# Altium footprint library 排针-排母-1.27.PcbLib: 152 footprints (part 9 of 10)
Each footprint in its own frame and in the unit in brackets; x right, y up, seen from the top. Pads: shape width x height; smd on the part's side, far side on the other; paste and mask are expansions set on the pad; w line width, h text height; cw(c..) or ccw(c..) is an arc to the next point about the centre after c.
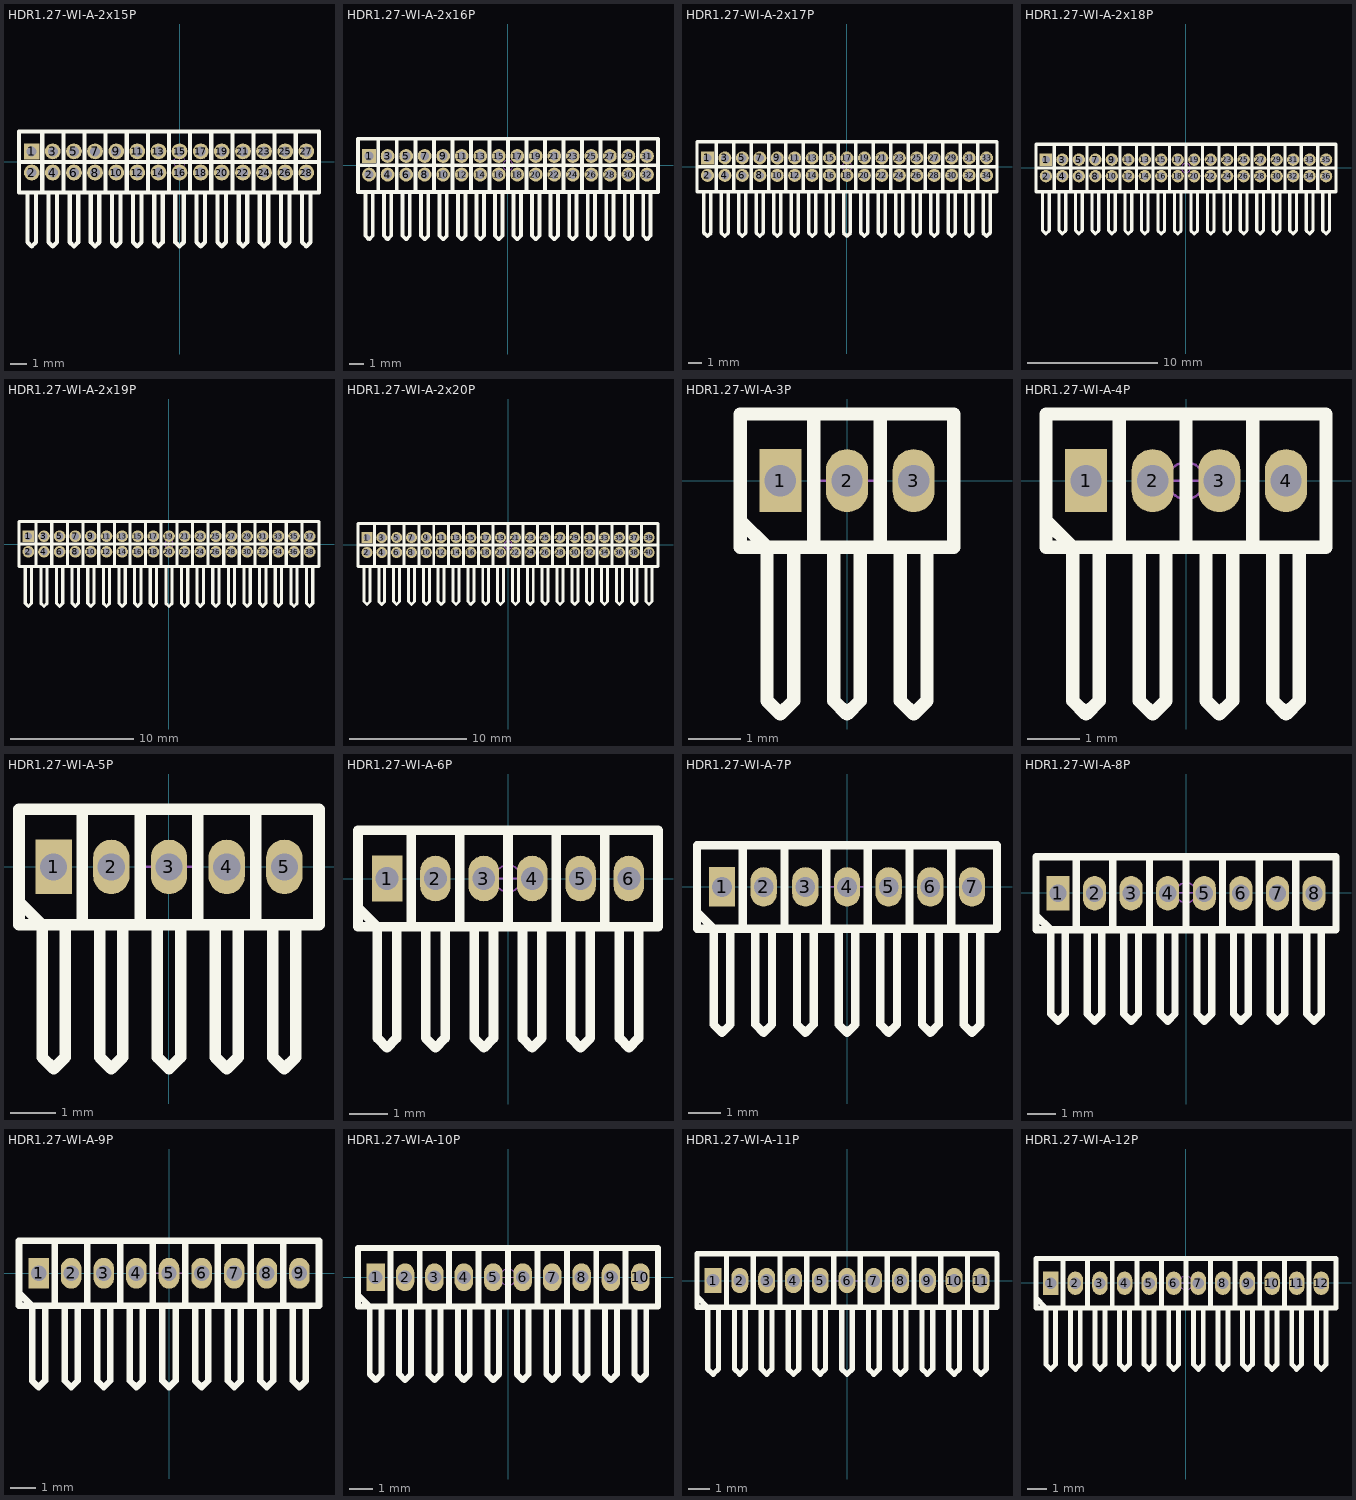
[diagram p8: the footprints below, top view; thin cyan lines are the x and y axes]

## HDR1.27-WI-A-2x15P [mm] "双排直插，脚距：1.27mm"
pads (28):
  rect 0.95x0.95 hole 0.6: 1(-8.89,0.635)
  round 0.95 hole 0.6: 2(-8.89,-0.635) 3(-7.62,0.635) 4(-7.62,-0.635) 5(-6.35,0.635) 6(-6.35,-0.635) 7(-5.08,0.635) 8(-5.08,-0.635) 9(-3.81,0.635) 10(-3.81,-0.635) 11(-2.54,0.635) 12(-2.54,-0.635) 13(-1.27,0.635) 14(-1.27,-0.635) 15(0,0.635) 16(0,-0.635) 17(1.27,0.635) 18(1.27,-0.635) 19(2.54,0.635) 20(2.54,-0.635) 21(3.81,0.635) 22(3.81,-0.635) 23(5.08,0.635) 24(5.08,-0.635) 25(6.35,0.635) 26(6.35,-0.635) 27(7.62,0.635) 28(7.62,-0.635)
Top Overlay:
  lines w0.254: -9.652,0 8.382,0 ; -9.144,-1.905 -9.144,-4.826 -8.89,-5.08 -8.636,-4.826 -8.636,-1.905 ; -8.255,-1.829 -8.255,1.829 ; -7.874,-1.905 -7.874,-4.826 -7.62,-5.08 -7.366,-4.826 -7.366,-1.905 ; -6.985,-1.829 -6.985,1.829 ; -6.604,-1.905 -6.604,-4.826 -6.35,-5.08 -6.096,-4.826 -6.096,-1.905 ; -5.715,-1.829 -5.715,1.829 ; -5.334,-1.905 -5.334,-4.826 -5.08,-5.08 -4.826,-4.826 -4.826,-1.905 ; -4.445,-1.829 -4.445,1.829 ; -4.064,-1.905 -4.064,-4.826 -3.81,-5.08 -3.556,-4.826 -3.556,-1.905 ; -3.175,-1.829 -3.175,1.829 ; -2.794,-1.905 -2.794,-4.826 -2.54,-5.08 -2.286,-4.826 -2.286,-1.905 ; -1.905,-1.829 -1.905,1.829 ; -1.524,-1.905 -1.524,-4.826 -1.27,-5.08 -1.016,-4.826 -1.016,-1.905 ; -0.635,-1.829 -0.635,1.829 ; -0.254,-1.905 -0.254,-4.826 0,-5.08 0.254,-4.826 0.254,-1.905 ; 0.635,-1.829 0.635,1.829 ; 1.016,-1.905 1.016,-4.826 1.27,-5.08 1.524,-4.826 1.524,-1.905 ; 1.905,-1.829 1.905,1.829 ; 2.286,-1.905 2.286,-4.826 2.54,-5.08 2.794,-4.826 2.794,-1.905 ; 3.175,-1.829 3.175,1.829 ; 3.556,-1.905 3.556,-4.826 3.81,-5.08 4.064,-4.826 4.064,-1.905 ; 4.445,-1.829 4.445,1.829 ; 4.826,-1.905 4.826,-4.826 5.08,-5.08 5.334,-4.826 5.334,-1.905 ; 5.715,-1.829 5.715,1.829 ; 6.096,-1.905 6.096,-4.826 6.35,-5.08 6.604,-4.826 6.604,-1.905 ; 6.985,-1.829 6.985,1.829 ; 7.366,-1.905 7.366,-4.826 7.62,-5.08 7.874,-4.826 7.874,-1.905 ; -9.652,-1.829 -9.652,1.829 8.382,1.829 8.382,-1.829 -9.652,-1.829
Mechanical 15:
  circle w0.05: c0,0 r0.35
  lines w0.05: -0.5,0 0.5,0 ; 0,-0.5 0,0.5
3D body: height 5.14, standoff -2.65, extent 6.985,-4.7 8.255,1.7
3D body: height 5.14, standoff -2.65, extent 5.715,-4.7 6.985,1.7
3D body: height 5.14, standoff -2.65, extent 4.445,-4.7 5.715,1.7
3D body: height 5.14, standoff -2.65, extent 3.175,-4.7 4.445,1.7
3D body: height 5.14, standoff -2.65, extent 1.905,-4.7 3.175,1.7
3D body: height 5.14, standoff -2.65, extent 0.635,-4.7 1.905,1.7
3D body: height 5.14, standoff -2.65, extent -0.635,-4.7 0.635,1.7
3D body: height 5.14, standoff -2.65, extent -1.905,-4.7 -0.635,1.7
3D body: height 5.14, standoff -2.65, extent -3.175,-4.7 -1.905,1.7
3D body: height 5.14, standoff -2.65, extent -4.445,-4.7 -3.175,1.7
3D body: height 5.14, standoff -2.65, extent -5.715,-4.7 -4.445,1.7
3D body: height 5.14, standoff -2.65, extent -6.985,-4.7 -5.715,1.7
3D body: height 5.14, standoff -2.65, extent -8.255,-4.7 -6.985,1.7
3D body: height 5.14, standoff -2.65, extent -9.525,-4.7 -8.255,1.7

## HDR1.27-WI-A-2x16P [mm] "双排直插，脚距：1.27mm"
pads (32):
  rect 0.95x0.95 hole 0.6: 1(-9.525,0.635)
  round 0.95 hole 0.6: 2(-9.525,-0.635) 3(-8.255,0.635) 4(-8.255,-0.635) 5(-6.985,0.635) 6(-6.985,-0.635) 7(-5.715,0.635) 8(-5.715,-0.635) 9(-4.445,0.635) 10(-4.445,-0.635) 11(-3.175,0.635) 12(-3.175,-0.635) 13(-1.905,0.635) 14(-1.905,-0.635) 15(-0.635,0.635) 16(-0.635,-0.635) 17(0.635,0.635) 18(0.635,-0.635) 19(1.905,0.635) 20(1.905,-0.635) 21(3.175,0.635) 22(3.175,-0.635) 23(4.445,0.635) 24(4.445,-0.635) 25(5.715,0.635) 26(5.715,-0.635) 27(6.985,0.635) 28(6.985,-0.635) 29(8.255,0.635) 30(8.255,-0.635) 31(9.525,0.635) 32(9.525,-0.635)
Top Overlay:
  lines w0.254: -10.287,0 10.287,0 ; -9.779,-1.905 -9.779,-4.826 -9.525,-5.08 -9.271,-4.826 -9.271,-1.905 ; -8.89,-1.829 -8.89,1.829 ; -8.509,-1.905 -8.509,-4.826 -8.255,-5.08 -8.001,-4.826 -8.001,-1.905 ; -7.62,-1.829 -7.62,1.829 ; -7.239,-1.905 -7.239,-4.826 -6.985,-5.08 -6.731,-4.826 -6.731,-1.905 ; -6.35,-1.829 -6.35,1.829 ; -5.969,-1.905 -5.969,-4.826 -5.715,-5.08 -5.461,-4.826 -5.461,-1.905 ; -5.08,-1.829 -5.08,1.829 ; -4.699,-1.905 -4.699,-4.826 -4.445,-5.08 -4.191,-4.826 -4.191,-1.905 ; -3.81,-1.829 -3.81,1.829 ; -3.429,-1.905 -3.429,-4.826 -3.175,-5.08 -2.921,-4.826 -2.921,-1.905 ; -2.54,-1.829 -2.54,1.829 ; -2.159,-1.905 -2.159,-4.826 -1.905,-5.08 -1.651,-4.826 -1.651,-1.905 ; -1.27,-1.829 -1.27,1.829 ; -0.889,-1.905 -0.889,-4.826 -0.635,-5.08 -0.381,-4.826 -0.381,-1.905 ; 0,-1.829 0,1.829 ; 0.381,-1.905 0.381,-4.826 0.635,-5.08 0.889,-4.826 0.889,-1.905 ; 1.27,-1.829 1.27,1.829 ; 1.651,-1.905 1.651,-4.826 1.905,-5.08 2.159,-4.826 2.159,-1.905 ; 2.54,-1.829 2.54,1.829 ; 2.921,-1.905 2.921,-4.826 3.175,-5.08 3.429,-4.826 3.429,-1.905 ; 3.81,-1.829 3.81,1.829 ; 4.191,-1.905 4.191,-4.826 4.445,-5.08 4.699,-4.826 4.699,-1.905 ; 5.08,-1.829 5.08,1.829 ; 5.461,-1.905 5.461,-4.826 5.715,-5.08 5.969,-4.826 5.969,-1.905 ; 6.35,-1.829 6.35,1.829 ; 6.731,-1.905 6.731,-4.826 6.985,-5.08 7.239,-4.826 7.239,-1.905 ; 7.62,-1.829 7.62,1.829 ; 8.001,-1.905 8.001,-4.826 8.255,-5.08 8.509,-4.826 8.509,-1.905 ; 8.89,-1.829 8.89,1.829 ; 9.271,-1.905 9.271,-4.826 9.525,-5.08 9.779,-4.826 9.779,-1.905 ; -10.287,-1.829 10.287,-1.829 10.287,1.829 -10.287,1.829 -10.287,-1.829
Mechanical 15:
  circle w0.05: c0,0 r0.35
  lines w0.05: -0.5,0 0.5,0 ; 0,-0.5 0,0.5
3D body: height 5.14, standoff -2.65, extent -10.16,-4.7 -8.89,1.7
3D body: height 5.14, standoff -2.65, extent -8.89,-4.7 -7.62,1.7
3D body: height 5.14, standoff -2.65, extent -7.62,-4.7 -6.35,1.7
3D body: height 5.14, standoff -2.65, extent -6.35,-4.7 -5.08,1.7
3D body: height 5.14, standoff -2.65, extent -5.08,-4.7 -3.81,1.7
3D body: height 5.14, standoff -2.65, extent -3.81,-4.7 -2.54,1.7
3D body: height 5.14, standoff -2.65, extent -2.54,-4.7 -1.27,1.7
3D body: height 5.14, standoff -2.65, extent -1.27,-4.7 0,1.7
3D body: height 5.14, standoff -2.65, extent 0,-4.7 1.27,1.7
3D body: height 5.14, standoff -2.65, extent 1.27,-4.7 2.54,1.7
3D body: height 5.14, standoff -2.65, extent 2.54,-4.7 3.81,1.7
3D body: height 5.14, standoff -2.65, extent 3.81,-4.7 5.08,1.7
3D body: height 5.14, standoff -2.65, extent 5.08,-4.7 6.35,1.7
3D body: height 5.14, standoff -2.65, extent 6.35,-4.7 7.62,1.7
3D body: height 5.14, standoff -2.65, extent 7.62,-4.7 8.89,1.7
3D body: height 5.14, standoff -2.65, extent 8.89,-4.7 10.16,1.7

## HDR1.27-WI-A-2x17P [mm] "双排直插，脚距：1.27mm"
pads (34):
  rect 0.95x0.95 hole 0.6: 1(-10.16,0.635)
  round 0.95 hole 0.6: 2(-10.16,-0.635) 3(-8.89,0.635) 4(-8.89,-0.635) 5(-7.62,0.635) 6(-7.62,-0.635) 7(-6.35,0.635) 8(-6.35,-0.635) 9(-5.08,0.635) 10(-5.08,-0.635) 11(-3.81,0.635) 12(-3.81,-0.635) 13(-2.54,0.635) 14(-2.54,-0.635) 15(-1.27,0.635) 16(-1.27,-0.635) 17(0,0.635) 18(0,-0.635) 19(1.27,0.635) 20(1.27,-0.635) 21(2.54,0.635) 22(2.54,-0.635) 23(3.81,0.635) 24(3.81,-0.635) 25(5.08,0.635) 26(5.08,-0.635) 27(6.35,0.635) 28(6.35,-0.635) 29(7.62,0.635) 30(7.62,-0.635) 31(8.89,0.635) 32(8.89,-0.635) 33(10.16,0.635) 34(10.16,-0.635)
Top Overlay:
  lines w0.254: -10.922,0 10.922,0 ; -10.414,-1.905 -10.414,-4.826 -10.16,-5.08 -9.906,-4.826 -9.906,-1.905 ; -9.525,-1.829 -9.525,1.829 ; -9.144,-1.905 -9.144,-4.826 -8.89,-5.08 -8.636,-4.826 -8.636,-1.905 ; -8.255,-1.829 -8.255,1.829 ; -7.874,-1.905 -7.874,-4.826 -7.62,-5.08 -7.366,-4.826 -7.366,-1.905 ; -6.985,-1.829 -6.985,1.829 ; -6.604,-1.905 -6.604,-4.826 -6.35,-5.08 -6.096,-4.826 -6.096,-1.905 ; -5.715,-1.829 -5.715,1.829 ; -5.334,-1.905 -5.334,-4.826 -5.08,-5.08 -4.826,-4.826 -4.826,-1.905 ; -4.445,-1.829 -4.445,1.829 ; -4.064,-1.905 -4.064,-4.826 -3.81,-5.08 -3.556,-4.826 -3.556,-1.905 ; -3.175,-1.829 -3.175,1.829 ; -2.794,-1.905 -2.794,-4.826 -2.54,-5.08 -2.286,-4.826 -2.286,-1.905 ; -1.905,-1.829 -1.905,1.829 ; -1.524,-1.905 -1.524,-4.826 -1.27,-5.08 -1.016,-4.826 -1.016,-1.905 ; -0.635,-1.829 -0.635,1.829 ; -0.254,-1.905 -0.254,-4.826 0,-5.08 0.254,-4.826 0.254,-1.905 ; 0.635,-1.829 0.635,1.829 ; 1.016,-1.905 1.016,-4.826 1.27,-5.08 1.524,-4.826 1.524,-1.905 ; 1.905,-1.829 1.905,1.829 ; 2.286,-1.905 2.286,-4.826 2.54,-5.08 2.794,-4.826 2.794,-1.905 ; 3.175,-1.829 3.175,1.829 ; 3.556,-1.905 3.556,-4.826 3.81,-5.08 4.064,-4.826 4.064,-1.905 ; 4.445,-1.829 4.445,1.829 ; 4.826,-1.905 4.826,-4.826 5.08,-5.08 5.334,-4.826 5.334,-1.905 ; 5.715,-1.829 5.715,1.829 ; 6.096,-1.905 6.096,-4.826 6.35,-5.08 6.604,-4.826 6.604,-1.905 ; 6.985,-1.829 6.985,1.829 ; 7.366,-1.905 7.366,-4.826 7.62,-5.08 7.874,-4.826 7.874,-1.905 ; 8.255,-1.829 8.255,1.829 ; 8.636,-1.905 8.636,-4.826 8.89,-5.08 9.144,-4.826 9.144,-1.905 ; 9.525,-1.829 9.525,1.829 ; 9.906,-1.905 9.906,-4.826 10.16,-5.08 10.414,-4.826 10.414,-1.905 ; -10.922,-1.829 10.922,-1.829 10.922,1.829 -10.922,1.829 -10.922,-1.829
Mechanical 15:
  circle w0.05: c0,0 r0.35
  lines w0.05: -0.5,0 0.5,0 ; 0,-0.5 0,0.5
3D body: height 5.14, standoff -2.65, extent -10.795,-4.7 -9.525,1.7
3D body: height 5.14, standoff -2.65, extent -9.525,-4.7 -8.255,1.7
3D body: height 5.14, standoff -2.65, extent -8.255,-4.7 -6.985,1.7
3D body: height 5.14, standoff -2.65, extent -6.985,-4.7 -5.715,1.7
3D body: height 5.14, standoff -2.65, extent -5.715,-4.7 -4.445,1.7
3D body: height 5.14, standoff -2.65, extent -4.445,-4.7 -3.175,1.7
3D body: height 5.14, standoff -2.65, extent -3.175,-4.7 -1.905,1.7
3D body: height 5.14, standoff -2.65, extent -1.905,-4.7 -0.635,1.7
3D body: height 5.14, standoff -2.65, extent -0.635,-4.7 0.635,1.7
3D body: height 5.14, standoff -2.65, extent 0.635,-4.7 1.905,1.7
3D body: height 5.14, standoff -2.65, extent 1.905,-4.7 3.175,1.7
3D body: height 5.14, standoff -2.65, extent 3.175,-4.7 4.445,1.7
3D body: height 5.14, standoff -2.65, extent 4.445,-4.7 5.715,1.7
3D body: height 5.14, standoff -2.65, extent 5.715,-4.7 6.985,1.7
3D body: height 5.14, standoff -2.65, extent 6.985,-4.7 8.255,1.7
3D body: height 5.14, standoff -2.65, extent 8.255,-4.7 9.525,1.7
3D body: height 5.14, standoff -2.65, extent 9.525,-4.7 10.795,1.7

## HDR1.27-WI-A-2x18P [mm] "双排直插，脚距：1.27mm"
pads (36):
  rect 0.95x0.95 hole 0.6: 1(-10.795,0.635)
  round 0.95 hole 0.6: 2(-10.795,-0.635) 3(-9.525,0.635) 4(-9.525,-0.635) 5(-8.255,0.635) 6(-8.255,-0.635) 7(-6.985,0.635) 8(-6.985,-0.635) 9(-5.715,0.635) 10(-5.715,-0.635) 11(-4.445,0.635) 12(-4.445,-0.635) 13(-3.175,0.635) 14(-3.175,-0.635) 15(-1.905,0.635) 16(-1.905,-0.635) 17(-0.635,0.635) 18(-0.635,-0.635) 19(0.635,0.635) 20(0.635,-0.635) 21(1.905,0.635) 22(1.905,-0.635) 23(3.175,0.635) 24(3.175,-0.635) 25(4.445,0.635) 26(4.445,-0.635) 27(5.715,0.635) 28(5.715,-0.635) 29(6.985,0.635) 30(6.985,-0.635) 31(8.255,0.635) 32(8.255,-0.635) 33(9.525,0.635) 34(9.525,-0.635) 35(10.795,0.635) 36(10.795,-0.635)
Top Overlay:
  lines w0.254: -11.557,0 11.557,0 ; -11.049,-1.905 -11.049,-4.826 -10.795,-5.08 -10.541,-4.826 -10.541,-1.905 ; -10.16,-1.829 -10.16,1.829 ; -9.779,-1.905 -9.779,-4.826 -9.525,-5.08 -9.271,-4.826 -9.271,-1.905 ; -8.89,-1.829 -8.89,1.829 ; -8.509,-1.905 -8.509,-4.826 -8.255,-5.08 -8.001,-4.826 -8.001,-1.905 ; -7.62,-1.829 -7.62,1.829 ; -7.239,-1.905 -7.239,-4.826 -6.985,-5.08 -6.731,-4.826 -6.731,-1.905 ; -6.35,-1.829 -6.35,1.829 ; -5.969,-1.905 -5.969,-4.826 -5.715,-5.08 -5.461,-4.826 -5.461,-1.905 ; -5.08,-1.829 -5.08,1.829 ; -4.699,-1.905 -4.699,-4.826 -4.445,-5.08 -4.191,-4.826 -4.191,-1.905 ; -3.81,-1.829 -3.81,1.829 ; -3.429,-1.905 -3.429,-4.826 -3.175,-5.08 -2.921,-4.826 -2.921,-1.905 ; -2.54,-1.829 -2.54,1.829 ; -2.159,-1.905 -2.159,-4.826 -1.905,-5.08 -1.651,-4.826 -1.651,-1.905 ; -1.27,-1.829 -1.27,1.829 ; -0.889,-1.905 -0.889,-4.826 -0.635,-5.08 -0.381,-4.826 -0.381,-1.905 ; 0,-1.829 0,1.829 ; 0.381,-1.905 0.381,-4.826 0.635,-5.08 0.889,-4.826 0.889,-1.905 ; 1.27,-1.829 1.27,1.829 ; 1.651,-1.905 1.651,-4.826 1.905,-5.08 2.159,-4.826 2.159,-1.905 ; 2.54,-1.829 2.54,1.829 ; 2.921,-1.905 2.921,-4.826 3.175,-5.08 3.429,-4.826 3.429,-1.905 ; 3.81,-1.829 3.81,1.829 ; 4.191,-1.905 4.191,-4.826 4.445,-5.08 4.699,-4.826 4.699,-1.905 ; 5.08,-1.829 5.08,1.829 ; 5.461,-1.905 5.461,-4.826 5.715,-5.08 5.969,-4.826 5.969,-1.905 ; 6.35,-1.829 6.35,1.829 ; 6.731,-1.905 6.731,-4.826 6.985,-5.08 7.239,-4.826 7.239,-1.905 ; 7.62,-1.829 7.62,1.829 ; 8.001,-1.905 8.001,-4.826 8.255,-5.08 8.509,-4.826 8.509,-1.905 ; 8.89,-1.829 8.89,1.829 ; 9.271,-1.905 9.271,-4.826 9.525,-5.08 9.779,-4.826 9.779,-1.905 ; 10.16,-1.829 10.16,1.829 ; 10.541,-1.905 10.541,-4.826 10.795,-5.08 11.049,-4.826 11.049,-1.905 ; -11.557,-1.829 11.557,-1.829 11.557,1.829 -11.557,1.829 -11.557,-1.829
Mechanical 15:
  circle w0.05: c0,0 r0.35
  lines w0.05: -0.5,0 0.5,0 ; 0,-0.5 0,0.5
3D body: height 5.14, standoff -2.65, extent -11.43,-4.7 -10.16,1.7
3D body: height 5.14, standoff -2.65, extent -10.16,-4.7 -8.89,1.7
3D body: height 5.14, standoff -2.65, extent -8.89,-4.7 -7.62,1.7
3D body: height 5.14, standoff -2.65, extent -7.62,-4.7 -6.35,1.7
3D body: height 5.14, standoff -2.65, extent -6.35,-4.7 -5.08,1.7
3D body: height 5.14, standoff -2.65, extent -5.08,-4.7 -3.81,1.7
3D body: height 5.14, standoff -2.65, extent -3.81,-4.7 -2.54,1.7
3D body: height 5.14, standoff -2.65, extent -2.54,-4.7 -1.27,1.7
3D body: height 5.14, standoff -2.65, extent -1.27,-4.7 0,1.7
3D body: height 5.14, standoff -2.65, extent 0,-4.7 1.27,1.7
3D body: height 5.14, standoff -2.65, extent 1.27,-4.7 2.54,1.7
3D body: height 5.14, standoff -2.65, extent 2.54,-4.7 3.81,1.7
3D body: height 5.14, standoff -2.65, extent 3.81,-4.7 5.08,1.7
3D body: height 5.14, standoff -2.65, extent 5.08,-4.7 6.35,1.7
3D body: height 5.14, standoff -2.65, extent 6.35,-4.7 7.62,1.7
3D body: height 5.14, standoff -2.65, extent 7.62,-4.7 8.89,1.7
3D body: height 5.14, standoff -2.65, extent 8.89,-4.7 10.16,1.7
3D body: height 5.14, standoff -2.65, extent 10.16,-4.7 11.43,1.7

## HDR1.27-WI-A-2x19P [mm] "双排直插，脚距：1.27mm"
pads (38):
  rect 0.95x0.95 hole 0.6: 1(-11.43,0.635)
  round 0.95 hole 0.6: 2(-11.43,-0.635) 3(-10.16,0.635) 4(-10.16,-0.635) 5(-8.89,0.635) 6(-8.89,-0.635) 7(-7.62,0.635) 8(-7.62,-0.635) 9(-6.35,0.635) 10(-6.35,-0.635) 11(-5.08,0.635) 12(-5.08,-0.635) 13(-3.81,0.635) 14(-3.81,-0.635) 15(-2.54,0.635) 16(-2.54,-0.635) 17(-1.27,0.635) 18(-1.27,-0.635) 19(0,0.635) 20(0,-0.635) 21(1.27,0.635) 22(1.27,-0.635) 23(2.54,0.635) 24(2.54,-0.635) 25(3.81,0.635) 26(3.81,-0.635) 27(5.08,0.635) 28(5.08,-0.635) 29(6.35,0.635) 30(6.35,-0.635) 31(7.62,0.635) 32(7.62,-0.635) 33(8.89,0.635) 34(8.89,-0.635) 35(10.16,0.635) 36(10.16,-0.635) 37(11.43,0.635) 38(11.43,-0.635)
Top Overlay:
  lines w0.254: -12.192,0 12.192,0 ; -11.684,-1.905 -11.684,-4.826 -11.43,-5.08 -11.176,-4.826 -11.176,-1.905 ; -10.795,-1.829 -10.795,1.829 ; -10.414,-1.905 -10.414,-4.826 -10.16,-5.08 -9.906,-4.826 -9.906,-1.905 ; -9.525,-1.829 -9.525,1.829 ; -9.144,-1.905 -9.144,-4.826 -8.89,-5.08 -8.636,-4.826 -8.636,-1.905 ; -8.255,-1.829 -8.255,1.829 ; -7.874,-1.905 -7.874,-4.826 -7.62,-5.08 -7.366,-4.826 -7.366,-1.905 ; -6.985,-1.829 -6.985,1.829 ; -6.604,-1.905 -6.604,-4.826 -6.35,-5.08 -6.096,-4.826 -6.096,-1.905 ; -5.715,-1.829 -5.715,1.829 ; -5.334,-1.905 -5.334,-4.826 -5.08,-5.08 -4.826,-4.826 -4.826,-1.905 ; -4.445,-1.829 -4.445,1.829 ; -4.064,-1.905 -4.064,-4.826 -3.81,-5.08 -3.556,-4.826 -3.556,-1.905 ; -3.175,-1.829 -3.175,1.829 ; -2.794,-1.905 -2.794,-4.826 -2.54,-5.08 -2.286,-4.826 -2.286,-1.905 ; -1.905,-1.829 -1.905,1.829 ; -1.524,-1.905 -1.524,-4.826 -1.27,-5.08 -1.016,-4.826 -1.016,-1.905 ; -0.635,-1.829 -0.635,1.829 ; -0.254,-1.905 -0.254,-4.826 0,-5.08 0.254,-4.826 0.254,-1.905 ; 0.635,-1.829 0.635,1.829 ; 1.016,-1.905 1.016,-4.826 1.27,-5.08 1.524,-4.826 1.524,-1.905 ; 1.905,-1.829 1.905,1.829 ; 2.286,-1.905 2.286,-4.826 2.54,-5.08 2.794,-4.826 2.794,-1.905 ; 3.175,-1.829 3.175,1.829 ; 3.556,-1.905 3.556,-4.826 3.81,-5.08 4.064,-4.826 4.064,-1.905 ; 4.445,-1.829 4.445,1.829 ; 4.826,-1.905 4.826,-4.826 5.08,-5.08 5.334,-4.826 5.334,-1.905 ; 5.715,-1.829 5.715,1.829 ; 6.096,-1.905 6.096,-4.826 6.35,-5.08 6.604,-4.826 6.604,-1.905 ; 6.985,-1.829 6.985,1.829 ; 7.366,-1.905 7.366,-4.826 7.62,-5.08 7.874,-4.826 7.874,-1.905 ; 8.255,-1.829 8.255,1.829 ; 8.636,-1.905 8.636,-4.826 8.89,-5.08 9.144,-4.826 9.144,-1.905 ; 9.525,-1.829 9.525,1.829 ; 9.906,-1.905 9.906,-4.826 10.16,-5.08 10.414,-4.826 10.414,-1.905 ; 10.795,-1.829 10.795,1.829 ; 11.176,-1.905 11.176,-4.826 11.43,-5.08 11.684,-4.826 11.684,-1.905 ; -12.192,-1.829 -12.192,1.829 12.192,1.829 12.192,-1.829 -12.192,-1.829
Mechanical 15:
  circle w0.05: c0,0 r0.35
  lines w0.05: -0.5,0 0.5,0 ; 0,-0.5 0,0.5
3D body: height 5.14, standoff -2.65, extent 10.795,-4.7 12.065,1.7
3D body: height 5.14, standoff -2.65, extent 9.525,-4.7 10.795,1.7
3D body: height 5.14, standoff -2.65, extent 8.255,-4.7 9.525,1.7
3D body: height 5.14, standoff -2.65, extent 6.985,-4.7 8.255,1.7
3D body: height 5.14, standoff -2.65, extent 5.715,-4.7 6.985,1.7
3D body: height 5.14, standoff -2.65, extent 4.445,-4.7 5.715,1.7
3D body: height 5.14, standoff -2.65, extent 3.175,-4.7 4.445,1.7
3D body: height 5.14, standoff -2.65, extent 1.905,-4.7 3.175,1.7
3D body: height 5.14, standoff -2.65, extent 0.635,-4.7 1.905,1.7
3D body: height 5.14, standoff -2.65, extent -0.635,-4.7 0.635,1.7
3D body: height 5.14, standoff -2.65, extent -1.905,-4.7 -0.635,1.7
3D body: height 5.14, standoff -2.65, extent -3.175,-4.7 -1.905,1.7
3D body: height 5.14, standoff -2.65, extent -4.445,-4.7 -3.175,1.7
3D body: height 5.14, standoff -2.65, extent -5.715,-4.7 -4.445,1.7
3D body: height 5.14, standoff -2.65, extent -6.985,-4.7 -5.715,1.7
3D body: height 5.14, standoff -2.65, extent -8.255,-4.7 -6.985,1.7
3D body: height 5.14, standoff -2.65, extent -9.525,-4.7 -8.255,1.7
3D body: height 5.14, standoff -2.65, extent -10.795,-4.7 -9.525,1.7
3D body: height 5.14, standoff -2.65, extent -12.065,-4.7 -10.795,1.7

## HDR1.27-WI-A-2x20P [mm] "双排直插，脚距：1.27mm"
pads (40):
  rect 0.95x0.95 hole 0.6: 1(-12.065,0.635)
  round 0.95 hole 0.6: 2(-12.065,-0.635) 3(-10.795,0.635) 4(-10.795,-0.635) 5(-9.525,0.635) 6(-9.525,-0.635) 7(-8.255,0.635) 8(-8.255,-0.635) 9(-6.985,0.635) 10(-6.985,-0.635) 11(-5.715,0.635) 12(-5.715,-0.635) 13(-4.445,0.635) 14(-4.445,-0.635) 15(-3.175,0.635) 16(-3.175,-0.635) 17(-1.905,0.635) 18(-1.905,-0.635) 19(-0.635,0.635) 20(-0.635,-0.635) 21(0.635,0.635) 22(0.635,-0.635) 23(1.905,0.635) 24(1.905,-0.635) 25(3.175,0.635) 26(3.175,-0.635) 27(4.445,0.635) 28(4.445,-0.635) 29(5.715,0.635) 30(5.715,-0.635) 31(6.985,0.635) 32(6.985,-0.635) 33(8.255,0.635) 34(8.255,-0.635) 35(9.525,0.635) 36(9.525,-0.635) 37(10.795,0.635) 38(10.795,-0.635) 39(12.065,0.635) 40(12.065,-0.635)
Top Overlay:
  lines w0.254: -12.827,0 12.827,0 ; -12.319,-1.905 -12.319,-4.826 -12.065,-5.08 -11.811,-4.826 -11.811,-1.905 ; -11.43,-1.829 -11.43,1.829 ; -11.049,-1.905 -11.049,-4.826 -10.795,-5.08 -10.541,-4.826 -10.541,-1.905 ; -10.16,-1.829 -10.16,1.829 ; -9.779,-1.905 -9.779,-4.826 -9.525,-5.08 -9.271,-4.826 -9.271,-1.905 ; -8.89,-1.829 -8.89,1.829 ; -8.509,-1.905 -8.509,-4.826 -8.255,-5.08 -8.001,-4.826 -8.001,-1.905 ; -7.62,-1.829 -7.62,1.829 ; -7.239,-1.905 -7.239,-4.826 -6.985,-5.08 -6.731,-4.826 -6.731,-1.905 ; -6.35,-1.829 -6.35,1.829 ; -5.969,-1.905 -5.969,-4.826 -5.715,-5.08 -5.461,-4.826 -5.461,-1.905 ; -5.08,-1.829 -5.08,1.829 ; -4.699,-1.905 -4.699,-4.826 -4.445,-5.08 -4.191,-4.826 -4.191,-1.905 ; -3.81,-1.829 -3.81,1.829 ; -3.429,-1.905 -3.429,-4.826 -3.175,-5.08 -2.921,-4.826 -2.921,-1.905 ; -2.54,-1.829 -2.54,1.829 ; -2.159,-1.905 -2.159,-4.826 -1.905,-5.08 -1.651,-4.826 -1.651,-1.905 ; -1.27,-1.829 -1.27,1.829 ; -0.889,-1.905 -0.889,-4.826 -0.635,-5.08 -0.381,-4.826 -0.381,-1.905 ; 0,-1.829 0,1.829 ; 0.381,-1.905 0.381,-4.826 0.635,-5.08 0.889,-4.826 0.889,-1.905 ; 1.27,-1.829 1.27,1.829 ; 1.651,-1.905 1.651,-4.826 1.905,-5.08 2.159,-4.826 2.159,-1.905 ; 2.54,-1.829 2.54,1.829 ; 2.921,-1.905 2.921,-4.826 3.175,-5.08 3.429,-4.826 3.429,-1.905 ; 3.81,-1.829 3.81,1.829 ; 4.191,-1.905 4.191,-4.826 4.445,-5.08 4.699,-4.826 4.699,-1.905 ; 5.08,-1.829 5.08,1.829 ; 5.461,-1.905 5.461,-4.826 5.715,-5.08 5.969,-4.826 5.969,-1.905 ; 6.35,-1.829 6.35,1.829 ; 6.731,-1.905 6.731,-4.826 6.985,-5.08 7.239,-4.826 7.239,-1.905 ; 7.62,-1.829 7.62,1.829 ; 8.001,-1.905 8.001,-4.826 8.255,-5.08 8.509,-4.826 8.509,-1.905 ; 8.89,-1.829 8.89,1.829 ; 9.271,-1.905 9.271,-4.826 9.525,-5.08 9.779,-4.826 9.779,-1.905 ; 10.16,-1.829 10.16,1.829 ; 10.541,-1.905 10.541,-4.826 10.795,-5.08 11.049,-4.826 11.049,-1.905 ; 11.43,-1.829 11.43,1.829 ; 11.811,-1.905 11.811,-4.826 12.065,-5.08 12.319,-4.826 12.319,-1.905 ; -12.827,-1.829 -12.827,1.829 12.827,1.829 12.827,-1.829 -12.827,-1.829
Mechanical 15:
  circle w0.05: c0,0 r0.35
  lines w0.05: -0.5,0 0.5,0 ; 0,-0.5 0,0.5
3D body: height 5.14, standoff -2.65, extent 11.43,-4.7 12.7,1.7
3D body: height 5.14, standoff -2.65, extent 10.16,-4.7 11.43,1.7
3D body: height 5.14, standoff -2.65, extent 8.89,-4.7 10.16,1.7
3D body: height 5.14, standoff -2.65, extent 7.62,-4.7 8.89,1.7
3D body: height 5.14, standoff -2.65, extent 6.35,-4.7 7.62,1.7
3D body: height 5.14, standoff -2.65, extent 5.08,-4.7 6.35,1.7
3D body: height 5.14, standoff -2.65, extent 3.81,-4.7 5.08,1.7
3D body: height 5.14, standoff -2.65, extent 2.54,-4.7 3.81,1.7
3D body: height 5.14, standoff -2.65, extent 1.27,-4.7 2.54,1.7
3D body: height 5.14, standoff -2.65, extent 0,-4.7 1.27,1.7
3D body: height 5.14, standoff -2.65, extent -1.27,-4.7 0,1.7
3D body: height 5.14, standoff -2.65, extent -2.54,-4.7 -1.27,1.7
3D body: height 5.14, standoff -2.65, extent -3.81,-4.7 -2.54,1.7
3D body: height 5.14, standoff -2.65, extent -5.08,-4.7 -3.81,1.7
3D body: height 5.14, standoff -2.65, extent -6.35,-4.7 -5.08,1.7
3D body: height 5.14, standoff -2.65, extent -7.62,-4.7 -6.35,1.7
3D body: height 5.14, standoff -2.65, extent -8.89,-4.7 -7.62,1.7
3D body: height 5.14, standoff -2.65, extent -10.16,-4.7 -8.89,1.7
3D body: height 5.14, standoff -2.65, extent -11.43,-4.7 -10.16,1.7
3D body: height 5.14, standoff -2.65, extent -12.7,-4.7 -11.43,1.7

## HDR1.27-WI-A-3P [mm] "直插，脚距：1.27mm"
pads (3):
  rect 0.8x1.2 hole 0.6: 1(-1.27,0)
  oval 0.8x1.2 hole 0.6: 2(0,0) 3(1.27,0)
Top Overlay:
  lines w0.254: -2.032,-0.762 -1.524,-1.27 ; -1.524,-1.397 -1.524,-4.191 -1.27,-4.445 -1.016,-4.191 -1.016,-1.27 ; -0.635,-1.27 -0.635,1.27 ; -0.254,-1.397 -0.254,-4.191 0,-4.445 0.254,-4.191 0.254,-1.27 ; 0.635,-1.27 0.635,1.2 ; 1.016,-1.27 1.016,-4.191 1.27,-4.445 1.524,-4.191 1.524,-1.27 ; -2.032,-1.27 -2.032,1.27 2.032,1.27 2.032,-1.27 -2.032,-1.27
Mechanical 15:
  circle w0.05: c0,0 r0.35
  lines w0.05: -0.5,0 0.5,0 ; 0,-0.5 0,0.5
3D body: height 3.96, standoff -2.72, extent -1.905,-4.7 1.905,1.2

## HDR1.27-WI-A-4P [mm] "直插，脚距：1.27mm"
pads (4):
  rect 0.8x1.2 hole 0.6: 1(-1.905,0)
  oval 0.8x1.2 hole 0.6: 2(-0.635,0) 3(0.635,0) 4(1.905,0)
Top Overlay:
  lines w0.254: -2.667,-0.762 -2.159,-1.27 ; -2.159,-1.397 -2.159,-4.191 -1.905,-4.445 -1.651,-4.191 -1.651,-1.27 ; -1.27,-1.27 -1.27,1.27 ; -0.889,-1.397 -0.889,-4.191 -0.635,-4.445 -0.381,-4.191 -0.381,-1.27 ; 0,-1.27 0,1.2 ; 0.381,-1.397 0.381,-4.191 0.635,-4.445 0.889,-4.191 0.889,-1.27 ; 1.27,-1.2 1.27,1.27 ; 1.651,-1.397 1.651,-4.191 1.905,-4.445 2.159,-4.191 2.159,-1.27 ; -2.667,-1.27 2.667,-1.27 2.667,1.27 -2.667,1.27 -2.667,-1.27
Mechanical 15:
  circle w0.05: c0,0 r0.35
  lines w0.05: -0.5,0 0.5,0 ; 0,-0.5 0,0.5
3D body: height 3.96, standoff -2.72, extent -2.54,-4.735 2.54,1.165

## HDR1.27-WI-A-5P [mm] "直插，脚距：1.27mm"
pads (5):
  rect 0.8x1.2 hole 0.6: 1(-2.54,0)
  oval 0.8x1.2 hole 0.6: 2(-1.27,0) 3(0,0) 4(1.27,0) 5(2.54,0)
Top Overlay:
  lines w0.254: -3.302,-0.762 -2.794,-1.27 ; -2.794,-1.397 -2.794,-4.191 -2.54,-4.445 -2.286,-4.191 -2.286,-1.27 ; -1.905,-1.27 -1.905,1.27 ; -1.524,-1.397 -1.524,-4.191 -1.27,-4.445 -1.016,-4.191 -1.016,-1.27 ; -0.635,-1.27 -0.635,1.2 ; -0.254,-1.397 -0.254,-4.191 0,-4.445 0.254,-4.191 0.254,-1.27 ; 0.635,-1.2 0.635,1.27 ; 1.016,-1.397 1.016,-4.191 1.27,-4.445 1.524,-4.191 1.524,-1.27 ; 1.905,1.27 1.905,-1.235 ; 2.286,-1.397 2.286,-4.191 2.54,-4.445 2.794,-4.191 2.794,-1.27 ; 1.905,-1.235 1.905,-1.235 ; -3.302,-1.27 -3.302,1.27 3.302,1.27 3.302,-1.27 -3.302,-1.27
Mechanical 15:
  circle w0.05: c0,0 r0.35
  lines w0.05: -0.5,0 0.5,0 ; 0,-0.5 0,0.5
3D body: height 3.96, standoff -2.72, extent -3.175,-4.7 3.175,1.2

## HDR1.27-WI-A-6P [mm] "直插，脚距：1.27mm"
pads (6):
  rect 0.8x1.2 hole 0.6: 1(-3.175,0)
  oval 0.8x1.2 hole 0.6: 2(-1.905,0) 3(-0.635,0) 4(0.635,0) 5(1.905,0) 6(3.175,0)
Top Overlay:
  lines w0.254: -3.937,-0.762 -3.429,-1.27 ; -3.429,-1.397 -3.429,-4.191 -3.175,-4.445 -2.921,-4.191 -2.921,-1.27 ; -2.54,-1.27 -2.54,1.27 ; -2.159,-1.397 -2.159,-4.191 -1.905,-4.445 -1.651,-4.191 -1.651,-1.27 ; -1.27,-1.27 -1.27,1.2 ; -0.889,-1.397 -0.889,-4.191 -0.635,-4.445 -0.381,-4.191 -0.381,-1.27 ; 0,-1.2 0,1.27 ; 0.381,-1.397 0.381,-4.191 0.635,-4.445 0.889,-4.191 0.889,-1.27 ; 1.27,1.27 1.27,-1.235 ; 1.651,-1.397 1.651,-4.191 1.905,-4.445 2.159,-4.191 2.159,-1.27 ; 2.54,-1.235 2.54,1.27 ; 2.921,-1.397 2.921,-4.191 3.175,-4.445 3.429,-4.191 3.429,-1.27 ; 1.27,-1.235 1.27,-1.235 ; -3.937,-1.27 -3.937,1.27 3.937,1.27 3.937,-1.27 -3.937,-1.27
Mechanical 15:
  circle w0.05: c0,0 r0.35
  lines w0.05: -0.5,0 0.5,0 ; 0,-0.5 0,0.5
3D body: height 3.96, standoff -2.72, extent -3.81,-4.7 3.81,1.2

## HDR1.27-WI-A-7P [mm] "直插，脚距：1.27mm"
pads (7):
  rect 0.8x1.2 hole 0.6: 1(-3.81,0)
  oval 0.8x1.2 hole 0.6: 2(-2.54,0) 3(-1.27,0) 4(0,0) 5(1.27,0) 6(2.54,0) 7(3.81,0)
Top Overlay:
  lines w0.254: -4.572,-0.762 -4.064,-1.27 ; -4.064,-1.397 -4.064,-4.191 -3.81,-4.445 -3.556,-4.191 -3.556,-1.27 ; -3.175,-1.27 -3.175,1.27 ; -2.794,-1.397 -2.794,-4.191 -2.54,-4.445 -2.286,-4.191 -2.286,-1.27 ; -1.905,-1.27 -1.905,1.2 ; -1.524,-1.397 -1.524,-4.191 -1.27,-4.445 -1.016,-4.191 -1.016,-1.27 ; -0.635,-1.2 -0.635,1.27 ; -0.254,-1.397 -0.254,-4.191 0,-4.445 0.254,-4.191 0.254,-1.27 ; 0.635,1.27 0.635,-1.235 ; 1.016,-1.397 1.016,-4.191 1.27,-4.445 1.524,-4.191 1.524,-1.27 ; 1.905,-1.235 1.905,1.27 ; 2.286,-1.397 2.286,-4.191 2.54,-4.445 2.794,-4.191 2.794,-1.27 ; 3.175,-1.235 3.175,1.27 ; 3.556,-1.397 3.556,-4.191 3.81,-4.445 4.064,-4.191 4.064,-1.27 ; 0.635,-1.235 0.635,-1.235 ; -4.572,-1.27 4.572,-1.27 4.572,1.27 -4.572,1.27 -4.572,-1.27
Mechanical 15:
  circle w0.05: c0,0 r0.35
  lines w0.05: -0.5,0 0.5,0 ; 0,-0.5 0,0.5
3D body: height 3.96, standoff -2.72, extent -4.445,-4.7 4.445,1.2

## HDR1.27-WI-A-8P [mm] "直插，脚距：1.27mm"
pads (8):
  rect 0.8x1.2 hole 0.6: 1(-4.445,-0.017)
  oval 0.8x1.2 hole 0.6: 2(-3.175,-0.017) 3(-1.905,-0.017) 4(-0.635,-0.017) 5(0.635,-0.017) 6(1.905,-0.017) 7(3.175,-0.017) 8(4.445,-0.017)
Top Overlay:
  lines w0.254: -5.207,-0.779 -4.699,-1.287 ; -4.699,-1.414 -4.699,-4.208 -4.445,-4.462 -4.191,-4.208 -4.191,-1.287 ; -3.81,-1.287 -3.81,1.253 ; -3.429,-1.414 -3.429,-4.208 -3.175,-4.462 -2.921,-4.208 -2.921,-1.287 ; -2.54,-1.287 -2.54,1.183 ; -2.159,-1.414 -2.159,-4.208 -1.905,-4.462 -1.651,-4.208 -1.651,-1.287 ; -1.27,-1.217 -1.27,1.253 ; -0.889,-1.414 -0.889,-4.208 -0.635,-4.462 -0.381,-4.208 -0.381,-1.287 ; 0,1.253 0,-1.253 ; 0.381,-1.414 0.381,-4.208 0.635,-4.462 0.889,-4.208 0.889,-1.287 ; 1.27,-1.253 1.27,1.253 ; 1.651,-1.414 1.651,-4.208 1.905,-4.462 2.159,-4.208 2.159,-1.287 ; 2.54,-1.253 2.54,1.253 ; 2.921,-1.414 2.921,-4.208 3.175,-4.462 3.429,-4.208 3.429,-1.287 ; 3.81,-1.253 3.81,1.253 ; 4.191,-1.414 4.191,-4.208 4.445,-4.462 4.699,-4.208 4.699,-1.287 ; 0,-1.253 0,-1.253 ; -5.207,-1.287 5.207,-1.287 5.207,1.253 -5.207,1.253 -5.207,-1.287
Mechanical 15:
  circle w0.05: c0,0 r0.35
  lines w0.05: -0.5,0 0.5,0 ; 0,-0.5 0,0.5
3D body: height 3.96, standoff -2.72, extent -5.08,-4.7 5.08,1.2

## HDR1.27-WI-A-9P [mm] "直插，脚距：1.27mm"
pads (9):
  rect 0.8x1.2 hole 0.6: 1(-5.08,0)
  oval 0.8x1.2 hole 0.6: 2(-3.81,0) 3(-2.54,0) 4(-1.27,0) 5(0,0) 6(1.27,0) 7(2.54,0) 8(3.81,0) 9(5.08,0)
Top Overlay:
  lines w0.254: -5.842,-0.762 -5.334,-1.27 ; -5.334,-1.397 -5.334,-4.191 -5.08,-4.445 -4.826,-4.191 -4.826,-1.27 ; -4.445,-1.27 -4.445,1.27 ; -4.064,-1.397 -4.064,-4.191 -3.81,-4.445 -3.556,-4.191 -3.556,-1.27 ; -3.175,-1.27 -3.175,1.2 ; -2.794,-1.397 -2.794,-4.191 -2.54,-4.445 -2.286,-4.191 -2.286,-1.27 ; -1.905,-1.2 -1.905,1.27 ; -1.524,-1.397 -1.524,-4.191 -1.27,-4.445 -1.016,-4.191 -1.016,-1.27 ; -0.635,1.27 -0.635,-1.235 ; -0.254,-1.397 -0.254,-4.191 0,-4.445 0.254,-4.191 0.254,-1.27 ; 0.635,-1.235 0.635,1.27 ; 1.016,-1.397 1.016,-4.191 1.27,-4.445 1.524,-4.191 1.524,-1.27 ; 1.905,-1.235 1.905,1.27 ; 2.286,-1.397 2.286,-4.191 2.54,-4.445 2.794,-4.191 2.794,-1.27 ; 3.175,-1.235 3.175,1.27 ; 3.556,-1.397 3.556,-4.191 3.81,-4.445 4.064,-4.191 4.064,-1.27 ; 4.445,-1.235 4.445,1.27 ; 4.826,-1.397 4.826,-4.191 5.08,-4.445 5.334,-4.191 5.334,-1.27 ; -0.635,-1.235 -0.635,-1.235 ; -5.842,-1.27 -5.842,1.27 5.842,1.27 5.842,-1.27 -5.842,-1.27
Mechanical 15:
  circle w0.05: c0,0 r0.35
  lines w0.05: -0.5,0 0.5,0 ; 0,-0.5 0,0.5
3D body: height 3.96, standoff -2.72, extent -5.715,-4.7 5.715,1.2

## HDR1.27-WI-A-10P [mm] "直插，脚距：1.27mm"
pads (10):
  rect 0.8x1.2 hole 0.6: 1(-5.715,0)
  oval 0.8x1.2 hole 0.6: 2(-4.445,0) 3(-3.175,0) 4(-1.905,0) 5(-0.635,0) 6(0.635,0) 7(1.905,0) 8(3.175,0) 9(4.445,0) 10(5.715,0)
Top Overlay:
  lines w0.254: -6.477,-0.762 -5.969,-1.27 ; -5.969,-1.397 -5.969,-4.191 -5.715,-4.445 -5.461,-4.191 -5.461,-1.27 ; -5.08,-1.27 -5.08,1.27 ; -4.699,-1.397 -4.699,-4.191 -4.445,-4.445 -4.191,-4.191 -4.191,-1.27 ; -3.81,-1.27 -3.81,1.2 ; -3.429,-1.397 -3.429,-4.191 -3.175,-4.445 -2.921,-4.191 -2.921,-1.27 ; -2.54,-1.2 -2.54,1.27 ; -2.159,-1.397 -2.159,-4.191 -1.905,-4.445 -1.651,-4.191 -1.651,-1.27 ; -1.27,1.27 -1.27,-1.235 ; -0.889,-1.397 -0.889,-4.191 -0.635,-4.445 -0.381,-4.191 -0.381,-1.27 ; 0,-1.235 0,1.27 ; 0.381,-1.397 0.381,-4.191 0.635,-4.445 0.889,-4.191 0.889,-1.27 ; 1.27,-1.235 1.27,1.27 ; 1.651,-1.397 1.651,-4.191 1.905,-4.445 2.159,-4.191 2.159,-1.27 ; 2.54,-1.235 2.54,1.27 ; 2.921,-1.397 2.921,-4.191 3.175,-4.445 3.429,-4.191 3.429,-1.27 ; 3.81,-1.235 3.81,1.27 ; 4.191,-1.397 4.191,-4.191 4.445,-4.445 4.699,-4.191 4.699,-1.27 ; 5.08,-1.235 5.08,1.27 ; 5.461,-1.397 5.461,-4.191 5.715,-4.445 5.969,-4.191 5.969,-1.27 ; -1.27,-1.235 -1.27,-1.235 ; -6.477,-1.27 6.477,-1.27 6.477,1.27 -6.477,1.27 -6.477,-1.27
Mechanical 15:
  circle w0.05: c0,0 r0.35
  lines w0.05: -0.5,0 0.5,0 ; 0,-0.5 0,0.5
3D body: height 3.96, standoff -2.72, extent -6.35,-4.7 6.35,1.2

## HDR1.27-WI-A-11P [mm] "直插，脚距：1.27mm"
pads (11):
  rect 0.8x1.2 hole 0.6: 1(-6.35,0)
  oval 0.8x1.2 hole 0.6: 2(-5.08,0) 3(-3.81,0) 4(-2.54,0) 5(-1.27,0) 6(0,0) 7(1.27,0) 8(2.54,0) 9(3.81,0) 10(5.08,0) 11(6.35,0)
Top Overlay:
  lines w0.254: -7.112,-0.762 -6.604,-1.27 ; -6.604,-1.397 -6.604,-4.191 -6.35,-4.445 -6.096,-4.191 -6.096,-1.27 ; -5.715,-1.27 -5.715,1.27 ; -5.334,-1.397 -5.334,-4.191 -5.08,-4.445 -4.826,-4.191 -4.826,-1.27 ; -4.445,-1.27 -4.445,1.2 ; -4.064,-1.397 -4.064,-4.191 -3.81,-4.445 -3.556,-4.191 -3.556,-1.27 ; -3.175,-1.2 -3.175,1.27 ; -2.794,-1.397 -2.794,-4.191 -2.54,-4.445 -2.286,-4.191 -2.286,-1.27 ; -1.905,1.27 -1.905,-1.235 ; -1.524,-1.397 -1.524,-4.191 -1.27,-4.445 -1.016,-4.191 -1.016,-1.27 ; -0.635,-1.235 -0.635,1.27 ; -0.254,-1.397 -0.254,-4.191 0,-4.445 0.254,-4.191 0.254,-1.27 ; 0.635,-1.235 0.635,1.27 ; 1.016,-1.397 1.016,-4.191 1.27,-4.445 1.524,-4.191 1.524,-1.27 ; 1.905,-1.235 1.905,1.27 ; 2.286,-1.397 2.286,-4.191 2.54,-4.445 2.794,-4.191 2.794,-1.27 ; 3.175,-1.235 3.175,1.27 ; 3.556,-1.397 3.556,-4.191 3.81,-4.445 4.064,-4.191 4.064,-1.27 ; 4.445,-1.235 4.445,1.27 ; 4.826,-1.397 4.826,-4.191 5.08,-4.445 5.334,-4.191 5.334,-1.27 ; 5.715,-1.235 5.715,1.27 ; 6.096,-1.397 6.096,-4.191 6.35,-4.445 6.604,-4.191 6.604,-1.27 ; -1.905,-1.235 -1.905,-1.235 ; -7.112,-1.27 -7.112,1.27 7.112,1.27 7.112,-1.27 -7.112,-1.27
Mechanical 15:
  circle w0.05: c0,0 r0.35
  lines w0.05: -0.5,0 0.5,0 ; 0,-0.5 0,0.5
3D body: height 3.96, standoff -2.72, extent -6.985,-4.7 6.985,1.2

## HDR1.27-WI-A-12P [mm] "直插，脚距：1.27mm"
pads (12):
  rect 0.8x1.2 hole 0.6: 1(-6.985,-0.018)
  oval 0.8x1.2 hole 0.6: 2(-5.715,-0.018) 3(-4.445,-0.018) 4(-3.175,-0.018) 5(-1.905,-0.018) 6(-0.635,-0.018) 7(0.635,-0.018) 8(1.905,-0.018) 9(3.175,-0.018) 10(4.445,-0.018) 11(5.715,-0.018) 12(6.985,-0.018)
Top Overlay:
  lines w0.254: -7.747,-0.78 -7.239,-1.288 ; -7.239,-1.415 -7.239,-4.209 -6.985,-4.463 -6.731,-4.209 -6.731,-1.288 ; -6.35,-1.288 -6.35,1.252 ; -5.969,-1.415 -5.969,-4.209 -5.715,-4.463 -5.461,-4.209 -5.461,-1.288 ; -5.08,-1.288 -5.08,1.182 ; -4.699,-1.415 -4.699,-4.209 -4.445,-4.463 -4.191,-4.209 -4.191,-1.288 ; -3.81,-1.218 -3.81,1.252 ; -3.429,-1.415 -3.429,-4.209 -3.175,-4.463 -2.921,-4.209 -2.921,-1.288 ; -2.54,1.252 -2.54,-1.253 ; -2.159,-1.415 -2.159,-4.209 -1.905,-4.463 -1.651,-4.209 -1.651,-1.288 ; -1.27,-1.253 -1.27,1.252 ; -0.889,-1.415 -0.889,-4.209 -0.635,-4.463 -0.381,-4.209 -0.381,-1.288 ; 0,-1.253 0,1.252 ; 0.381,-1.415 0.381,-4.209 0.635,-4.463 0.889,-4.209 0.889,-1.288 ; 1.27,-1.253 1.27,1.252 ; 1.651,-1.415 1.651,-4.209 1.905,-4.463 2.159,-4.209 2.159,-1.288 ; 2.54,-1.253 2.54,1.252 ; 2.921,-1.415 2.921,-4.209 3.175,-4.463 3.429,-4.209 3.429,-1.288 ; 3.81,-1.253 3.81,1.252 ; 4.191,-1.415 4.191,-4.209 4.445,-4.463 4.699,-4.209 4.699,-1.288 ; 5.08,-1.253 5.08,1.252 ; 5.461,-1.415 5.461,-4.209 5.715,-4.463 5.969,-4.209 5.969,-1.288 ; 6.35,-1.253 6.35,1.252 ; 6.731,-1.415 6.731,-4.209 6.985,-4.463 7.239,-4.209 7.239,-1.288 ; -2.54,-1.253 -2.54,-1.253 ; -7.747,-1.288 7.747,-1.288 7.747,1.252 -7.747,1.252 -7.747,-1.288
Mechanical 15:
  circle w0.05: c0,0 r0.35
  lines w0.05: -0.5,0 0.5,0 ; 0,-0.5 0,0.5
3D body: height 3.96, standoff -2.72, extent -7.62,-4.7 7.62,1.2